# Altium footprint library MiscDevices.PcbLib: 251 footprints (part 7 of 16)
Each footprint in its own frame and in the unit in brackets; x right, y up, seen from the top. Pads: shape width x height; smd on the part's side, far side on the other; paste and mask are expansions set on the pad; w line width, h text height; cw(c..) or ccw(c..) is an arc to the next point about the centre after c.
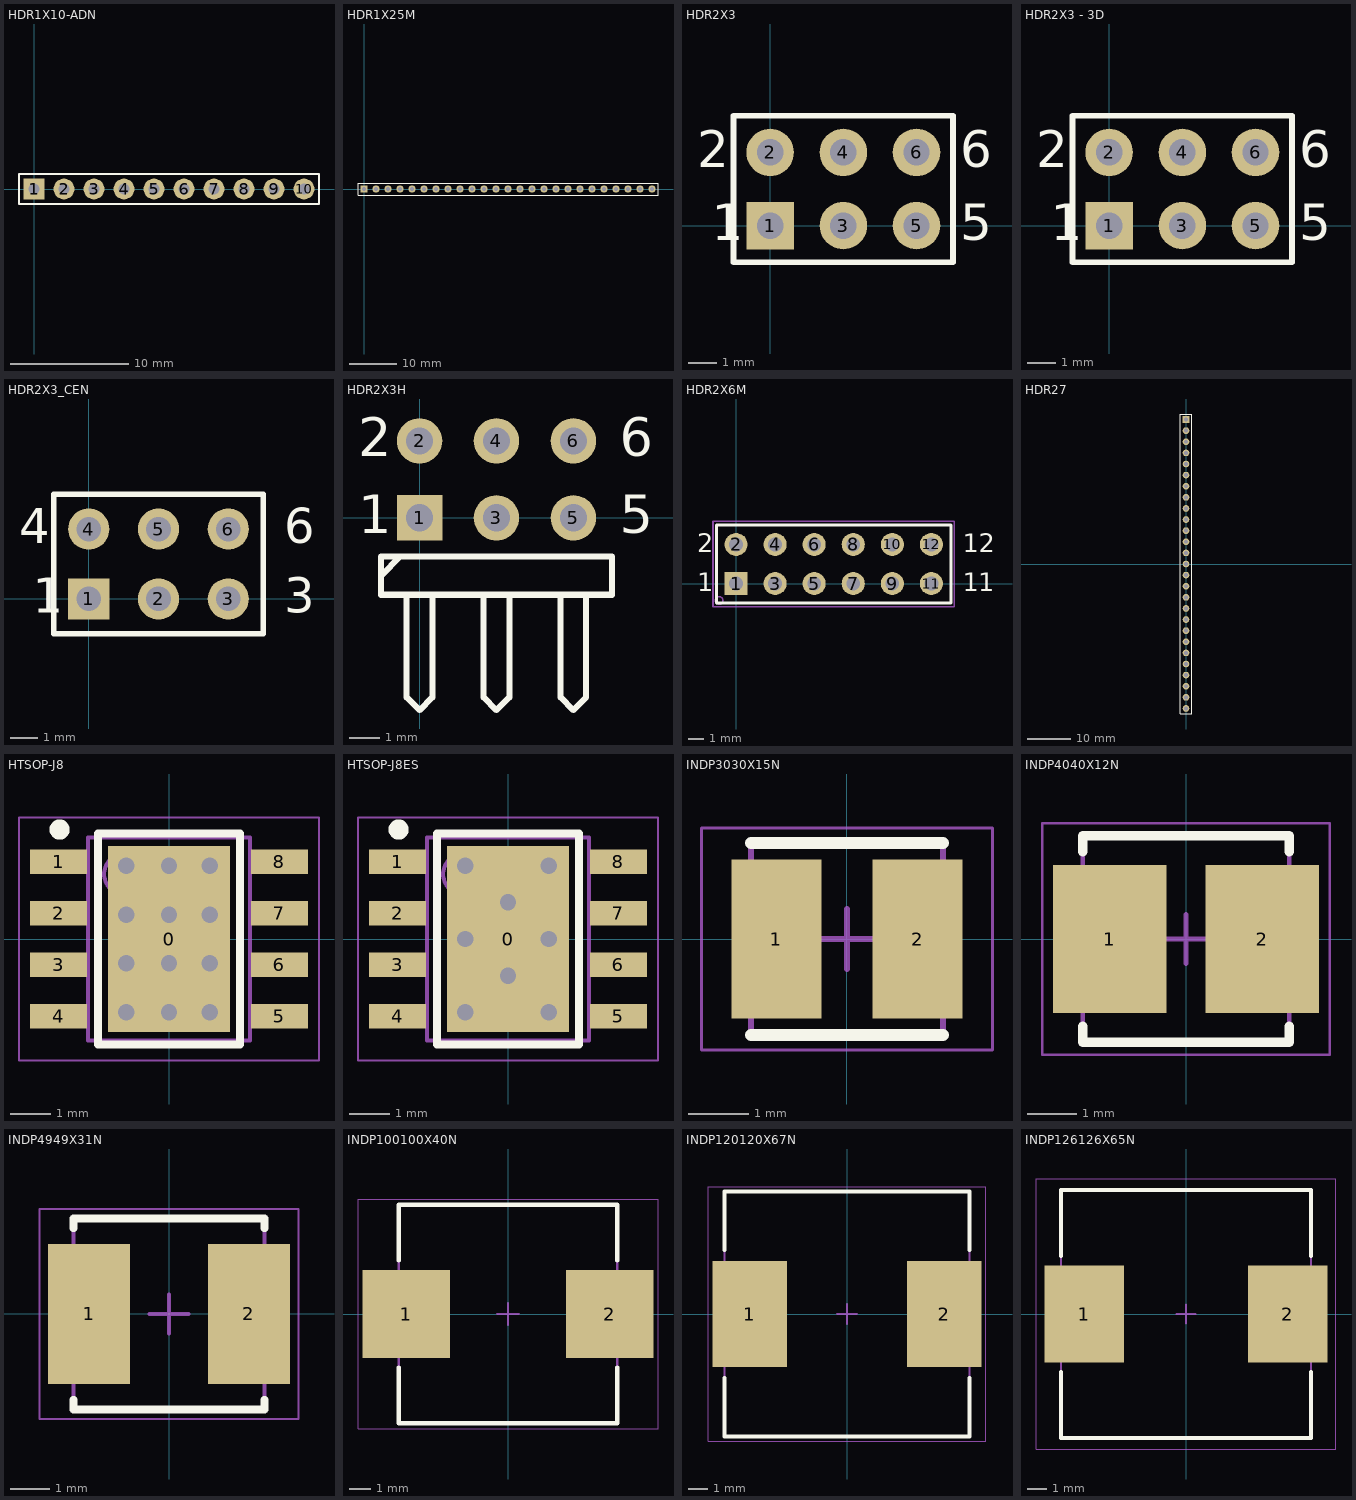
[diagram p6: the footprints below, top view; thin cyan lines are the x and y axes]

## HDR1X10-ADN [mil] "Connector; Header; 10 Position Arduino Stackable"
height 433.07
pads (10):
  rect 70x70 hole 36: 1(0,0)
  round 70 hole 36: 2(100,0) 3(200,0) 4(300,0) 5(400,0) 6(500,0) 7(600,0) 8(700,0) 9(800,0) 10(900,0)
Top Overlay:
  lines w7.87: -50,-50 950,-50 950,50 25,50 -50,50 -50,-50
Top Designator (Mech7):
  text ".Designator" at 150.1,-19.99 h60
3D body "User Library-SIL_Socket10_.STEP": height 334.65, standoff -411.79, extent -50,-50 950,50

## HDR1X25M [mm] "Connector; Header; 25 Position"
height 12
pads (25):
  rect 1.5x1.5 hole 0.9: 1(0,0)
  round 1.5 hole 0.9: 2(2.54,0) 3(5.08,0) 4(7.62,0) 5(10.16,0) 6(12.7,0) 7(15.24,0) 8(17.78,0) 9(20.32,0) 10(22.86,0) 11(25.4,0) 12(27.94,0) 13(30.48,0) 14(33.02,0) 15(35.56,0) 16(38.1,0) 17(40.64,0) 18(43.18,0) 19(45.72,0) 20(48.26,0) 21(50.8,0) 22(53.34,0) 23(55.88,0) 24(58.42,0) 25(60.96,0)
Top Overlay:
  lines w0.2: -1.27,-1.27 -1.27,1.27 0.635,1.27 62.23,1.27 62.23,-1.27 -1.27,-1.27
Top Designator (Mech7):
  text ".Designator" at 22.862,-0.508 h1.52
3D body "1x25M_HEADER.STEP": height 8.54, standoff -2.96, extent -1.27,-1.27 62.23,1.27

## HDR2X3 [mil] "Connector; Header; 3x2 Position"
height 433.07
pads (6):
  rect 65x65 hole 36: 1(0,0)
  round 65 hole 36: 2(0,100) 3(100,0) 4(100,100) 5(200,0) 6(200,100)
Top Overlay:
  lines w7.87: 58.33,-50 250,-50 ; 250,-50 250,150 -50,150 -50,-50 250,-50
  text "6" at 260,80 h50
  text "5" at 260,-20 h50
  text "2" at -100,80 h50
  text "1" at -80,-20 h50
Top Designator (Mech7):
  text ".Designator" at -199.9,30.01 h60

## HDR2X3 - 3D [mil] "Connector; Header; 3x2 Position"
height 433.07
pads (6):
  rect 65x65 hole 36: 1(0,0)
  round 65 hole 36: 2(0,100) 3(100,0) 4(100,100) 5(200,0) 6(200,100)
Top Overlay:
  lines w7.87: 58.33,-50 250,-50 ; 250,-50 -50,-50 -50,150 250,150 250,-50
  text "1" at -80,-20 h50
  text "2" at -100,80 h50
  text "5" at 260,-20 h50
  text "6" at 260,80 h50
Top Designator (Mech7):
  text ".Designator" at -199.9,30.01 h60
3D body "ADN_HDR3x2.STEP": height 433.07, standoff -511.81, extent -57.48,-53.34 257.48,153.35

## HDR2X3_CEN [mm] "Connector; Header; 3x2 Position"
pads (6):
  rect 1.5x1.5 hole 0.9: 1(0,0)
  round 1.5 hole 0.9: 2(2.54,0) 3(5.08,0) 4(0,2.54) 5(2.54,2.54) 6(5.08,2.54)
Top Overlay:
  lines w0.2: -1.27,-1.27 6.35,-1.27 6.35,3.81 -1.27,3.81 -1.27,-1.27
  text "6" at 7.112,2.032 h1.27
  text "3" at 7.112,-0.508 h1.27
  text "1" at -2.032,-0.508 h1.27
  text "4" at -2.54,2.032 h1.27
Top Designator (Mech7):
  text ".Designator" at -5.078,0.762 h1.52
3D body "pin_header_awl254-dg-g06d.stp": height 8.5, standoff -3, extent -1.31,-1.29 6.31,3.79

## HDR2X3H [mm] "Connector; Header; 3x2 Position; Right Angle"
pads (6):
  rect 1.5x1.5 hole 0.9: 1(0,0)
  round 1.5 hole 0.9: 2(0,2.54) 3(2.54,0) 4(2.54,2.54) 5(5.08,0) 6(5.08,2.54)
Top Overlay:
  lines w0.2: -1.27,-1.905 -0.635,-1.27 ; -0.423,-2.54 -0.423,-5.927 0,-6.35 0.423,-5.927 0.423,-2.54 ; 2.117,-2.54 2.117,-5.927 2.54,-6.35 2.963,-5.927 2.963,-2.54 ; 4.657,-2.54 4.657,-5.927 5.08,-6.35 5.503,-5.927 5.503,-2.54 ; -1.27,-2.54 6.35,-2.54 6.35,-1.27 -1.27,-1.27 -1.27,-2.54
  text "2" at -2.032,2.032 h1.27
  text "1" at -2.032,-0.508 h1.27
  text "5" at 6.604,-0.508 h1.27
  text "6" at 6.604,2.032 h1.27
Top Designator (Mech7):
  text ".Designator" at -5.078,0.762 h1.52
3D body "pin_header_awl254-da-g06d.stp": height 5.01, standoff -2.99, extent -1.27,-10 6.35,2.88

## HDR2X6M [mm] "Connector; Header; 6x2 Position"
pads (12):
  rect 1.5x1.5 hole 0.9: 1(0,0)
  round 1.5 hole 0.9: 2(0,2.54) 3(2.54,0) 4(2.54,2.54) 5(5.08,0) 6(5.08,2.54) 7(7.62,0) 8(7.62,2.54) 9(10.16,0) 10(10.16,2.54) 11(12.7,0) 12(12.7,2.54)
Top Overlay:
  lines w0.2: -1.27,-1.27 -1.27,3.81 13.97,3.81 13.97,-1.27 -1.27,-1.27
  text "2" at -2.54,2.032 h1.22
  text "1" at -2.54,-0.508 h1.22
  text "1" at 14.732,-0.508 h1.22
  text "1" at 15.748,-0.508 h1.22
  text "12" at 14.732,2.032 h1.22
Top Designator (Mech7):
  text ".Designator" at -0.618,0.762 h1.52
Top Courtyard:
  circle w0.1: c-1.1,-1.1 r0.25
  lines w0.1: -1.5,-1.5 14.2,-1.5 14.2,4.04 -1.5,4.04 -1.5,-1.5
3D body "HDR2X6M.STEP": height 8.55, standoff -2.99, extent -1.27,-1.27 13.97,3.81

## HDR27 [mil] "2.54mm pitch HEADER"
pads (27):
  rect 60x60 hole 35.43: 1(0,1300)
  round 60 hole 35.43: 2(0,1200) 3(0,1100) 4(0,1000) 5(0,900) 6(0,800) 7(0,700) 8(0,600) 9(0,500) 10(0,400) 11(0,300) 12(0,200) 13(0,100) 14(0,0) 15(0,-100) 16(0,-200) 17(0,-300) 18(0,-400) 19(0,-500) 20(0,-600) 21(0,-700) 22(0,-800) 23(0,-900) 24(0,-1000) 25(0,-1100) 26(0,-1200) 27(0,-1300)
Top Overlay:
  lines w5.91: -50,-1350 -50,1350 50,1350 50,-1350 -50,-1350
Top Designator (Mech7):
  text ".Designator" at -299.9,-19.99 h60
3D body "1x27M_HEADER.STEP": height 336.72, standoff -116.04, extent -49.99,-1349.99 50.01,1350.01

## HTSOP-J8 [mm] "TSOP, 8-Leads, Body 4.90x3.90mm, Pitch 1.27mm, Thermal Pad 3.20x2.40mm, IPC Medium Density"
height 1
pads (9):
  rect 3x4.6 smd: 0(0,0)
  rect 1.4x0.6 smd: 1(-2.725,1.905) 2(-2.725,0.635) 3(-2.725,-0.635) 4(-2.725,-1.905) 5(2.725,-1.905) 6(2.725,-0.635) 7(2.725,0.635) 8(2.725,1.905)
via 0,1.805 diameter 0.914 hole 0.406
via 1,1.805 diameter 0.914 hole 0.406
via 1,-1.805 diameter 0.914 hole 0.406
via 1,-0.602 diameter 0.914 hole 0.406
via 1,0.602 diameter 0.914 hole 0.406
via -1.05,1.805 diameter 0.914 hole 0.406
via -1.05,0.602 diameter 0.914 hole 0.406
via 0,0.602 diameter 0.914 hole 0.406
via -1.05,-0.602 diameter 0.914 hole 0.406
via 0,-0.602 diameter 0.914 hole 0.406
via -1.05,-1.805 diameter 0.914 hole 0.406
via 0,-1.805 diameter 0.914 hole 0.406
Top Overlay:
  circle w0.25: c-2.7,2.7 r0.125
  lines w0.2: -1.75,-2.6 -1.75,2.6 1.75,2.6 1.75,-2.6 -1.75,-2.6
Top Designator (Mech7):
  text ".Designator" at -7.618,-0.508 h1.52
Top Assembly:
  circle w0.1: c-1.1,1.6 r0.5
  lines w0.1: -2,-2.5 -2,2.5 2,2.5 2,-2.5 -2,-2.5
Top Courtyard:
  lines w0.05: -3.7,-3 -3.7,3 3.7,3 3.7,-3 -3.7,-3
  lines w0.1: -0.5,0 0.5,0 ; 0,-0.5 0,0.5
3D body "HTSOP-J8.step": height 1, standoff 0, extent -3,-2.5 3,2.5

## HTSOP-J8ES [mm] "TSOP, 8-Leads, Body 4.90x3.90mm, Pitch 1.27mm, Thermal Pad 3.20x2.40mm, IPC Medium Density"
height 1
pads (9):
  rect 3x4.6 smd: 0(0,0)
  rect 1.4x0.6 smd: 1(-2.725,1.905) 2(-2.725,0.635) 3(-2.725,-0.635) 4(-2.725,-1.905) 5(2.725,-1.905) 6(2.725,-0.635) 7(2.725,0.635) 8(2.725,1.905)
via -1.05,-1.805 diameter 0.914 hole 0.406
via 0,-0.903 diameter 0.914 hole 0.406
via 0,0.902 diameter 0.914 hole 0.406
via -1.05,0 diameter 0.914 hole 0.406
via -1.05,1.805 diameter 0.914 hole 0.406
via 1,0 diameter 0.914 hole 0.406
via 1,-1.805 diameter 0.914 hole 0.406
via 1,1.805 diameter 0.914 hole 0.406
Top Overlay:
  circle w0.25: c-2.7,2.7 r0.125
  lines w0.2: -1.75,-2.6 1.75,-2.6 1.75,2.6 -1.75,2.6 -1.75,-2.6
Top Designator (Mech7):
  text ".Designator" at -7.618,-0.508 h1.52
Top Assembly:
  circle w0.1: c-1.1,1.6 r0.5
  lines w0.1: -2,-2.5 2,-2.5 2,2.5 -2,2.5 -2,-2.5
Top Courtyard:
  lines w0.05: -3.7,-3 3.7,-3 3.7,3 -3.7,3 -3.7,-3
  lines w0.1: -0.5,0 0.5,0 ; 0,-0.5 0,0.5
3D body "HTSOP-J8.step": height 1, standoff 0, extent -3,-2.5 3,2.5

## INDP3030X15N [mm] "Precision Wire Wound Inductor, 2-Leads, Body 3.00x3.00mm, IPC Medium Density"
height 1.5
pads (2):
  rect 1.5x2.65 smd: 1(-1.175,0) 2(1.175,0)
Top Overlay:
  lines w0.2: -1.6,-1.6 1.6,-1.6 ; -1.6,1.6 1.6,1.6
Top Designator (Mech7):
  text ".Designator" at -7.618,-0.508 h1.52
Top Assembly:
  lines w0.1: -1.6,-1.6 1.6,-1.6 1.6,1.6 -1.6,1.6 -1.6,-1.6
Top Courtyard:
  lines w0.05: -2.425,-1.85 2.425,-1.85 2.425,1.85 -2.425,1.85 -2.425,-1.85
  lines w0.1: -0.5,0 0.5,0 ; 0,-0.5 0,0.5
3D body "INDP3030X15N.step": height 1.6, standoff 0, extent -1.6,-1.5 1.6,1.5

## INDP4040X12N [mm] "Precision Wire Wound Inductor, 2-Leads, Body 4.00x4.00mm, IPC Medium Density"
height 1.2
pads (2):
  rect 2.3x3 smd: 1(-1.55,0) 2(1.55,0)
Top Overlay:
  lines w0.2: -2.1,-1.775 -2.1,-2.1 2.1,-2.1 2.1,-1.775 ; -2.1,1.775 -2.1,2.1 2.1,2.1 2.1,1.775
Top Designator (Mech7):
  text ".Designator" at -7.618,-0.508 h1.52
Top Assembly:
  lines w0.1: -2.1,-2.1 2.1,-2.1 2.1,2.1 -2.1,2.1 -2.1,-2.1
Top Courtyard:
  lines w0.05: -2.925,-2.35 2.925,-2.35 2.925,2.35 -2.925,2.35 -2.925,-2.35
  lines w0.1: -0.5,0 0.5,0 ; 0,-0.5 0,0.5
3D body "User Library-IFSC-1515AH.STEP": height 1.8, standoff 0, extent -1.975,-1.975 1.975,1.975

## INDP4949X31N [mm] "Precision Wire Wound Inductor, 2-Leads, Body 4.90x4.90mm, IPC Medium Density"
height 3.1
pads (2):
  rect 2.1x3.6 smd: 1(-2.05,0) 2(2.05,0)
Top Overlay:
  lines w0.2: -2.45,-2.2 -2.45,-2.45 2.45,-2.45 2.45,-2.2 ; -2.45,2.2 -2.45,2.45 2.45,2.45 2.45,2.2
Top Designator (Mech7):
  text ".Designator" at -7.618,-0.508 h1.52
Top Assembly:
  lines w0.1: -2.45,-2.45 -2.45,2.45 2.45,2.45 2.45,-2.45 -2.45,-2.45
Top Courtyard:
  lines w0.05: -3.325,-2.7 -3.325,2.7 3.325,2.7 3.325,-2.7 -3.325,-2.7
  lines w0.1: -0.5,0 0.5,0 ; 0,-0.5 0,0.5
3D body "INDP4949X31N.step": height 3.2, standoff 0, extent -2.55,-2.45 2.55,2.45

## INDP100100X40N [mm] "Precision Wire Wound Inductor, 2-Leads, Body 10.00x10.00mm, IPC Medium Density"
height 4
pads (2):
  rect 4.1x4.1 smd: 1(-4.75,0) 2(4.75,0)
Top Overlay:
  lines w0.2: -5.1,-2.5 -5.1,-5.1 5.1,-5.1 5.1,-2.5 ; -5.1,2.5 -5.1,5.1 5.1,5.1 5.1,2.5
Top Designator (Mech7):
  text ".Designator" at -7.618,-0.508 h1.52
Top Assembly:
  lines w0.1: -5.1,-5.1 -5.1,5.1 5.1,5.1 5.1,-5.1 -5.1,-5.1
Top Courtyard:
  lines w0.05: -7,-5.35 -7,5.35 7,5.35 7,-5.35 -7,-5.35
  lines w0.1: -0.5,0 0.5,0 ; 0,-0.5 0,0.5
3D body "User Library-SMPI1004HW.STEP": height 3.92, standoff 0.02, extent -5.1,-5.1 5.3,4.9

## INDP120120X67N [mm] "Precision Wire Wound Inductor, 2-Leads, Body 12.00x12.00mm, IPC Medium Density"
height 6.7
pads (2):
  rect 3.8x5.4 smd: 1(-4.95,0) 2(4.95,0)
Top Overlay:
  lines w0.2: -6.25,-3.25 -6.25,-6.25 6.25,-6.25 6.25,-3.25 ; -6.25,3.25 -6.25,6.25 6.25,6.25 6.25,3.25
Top Designator (Mech7):
  text ".Designator" at -7.618,-0.508 h1.52
Top Assembly:
  lines w0.1: -6.25,-6.25 -6.25,6.25 6.25,6.25 6.25,-6.25 -6.25,-6.25
Top Courtyard:
  lines w0.05: -7.075,-6.5 -7.075,6.5 7.075,6.5 7.075,-6.5 -7.075,-6.5
  lines w0.1: -0.5,0 0.5,0 ; 0,-0.5 0,0.5
3D body "User Library-MSS1260.STEP": height 6.16, standoff 0.02, extent -6.125,-6.15 6.175,6.15

## INDP126126X65N [mm] "Precision Wire Wound Inductor, 2-Leads, Body 12.60x12.60mm, IPC Medium Density"
height 6.5
pads (2):
  rect 4.1x5 smd: 1(-5.25,0) 2(5.25,0)
Top Overlay:
  lines w0.2: -6.45,-3 -6.45,-6.4 6.45,-6.4 6.45,-3 ; -6.45,3 -6.45,6.4 6.45,6.4 6.45,3
Top Designator (Mech7):
  text ".Designator" at -7.618,-0.508 h1.52
Top Assembly:
  lines w0.1: -6.45,-6.4 -6.45,6.4 6.45,6.4 6.45,-6.4 -6.45,-6.4
Top Courtyard:
  lines w0.05: -7.75,-7 -7.75,7 7.75,7 7.75,-7 -7.75,-7
  lines w0.1: -0.5,0 0.5,0 ; 0,-0.5 0,0.5
3D body "User Library-MSS1260.STEP": height 6.16, standoff 0.02, extent -6.125,-6.15 6.175,6.15